# Altium footprint library lib_protel_HC.PCBLIB: 724 footprints (part 42 of 46)
Each footprint in its own frame and in the unit in brackets; x right, y up, seen from the top. Pads: shape width x height; smd on the part's side, far side on the other; paste and mask are expansions set on the pad; w line width, h text height; cw(c..) or ccw(c..) is an arc to the next point about the centre after c.
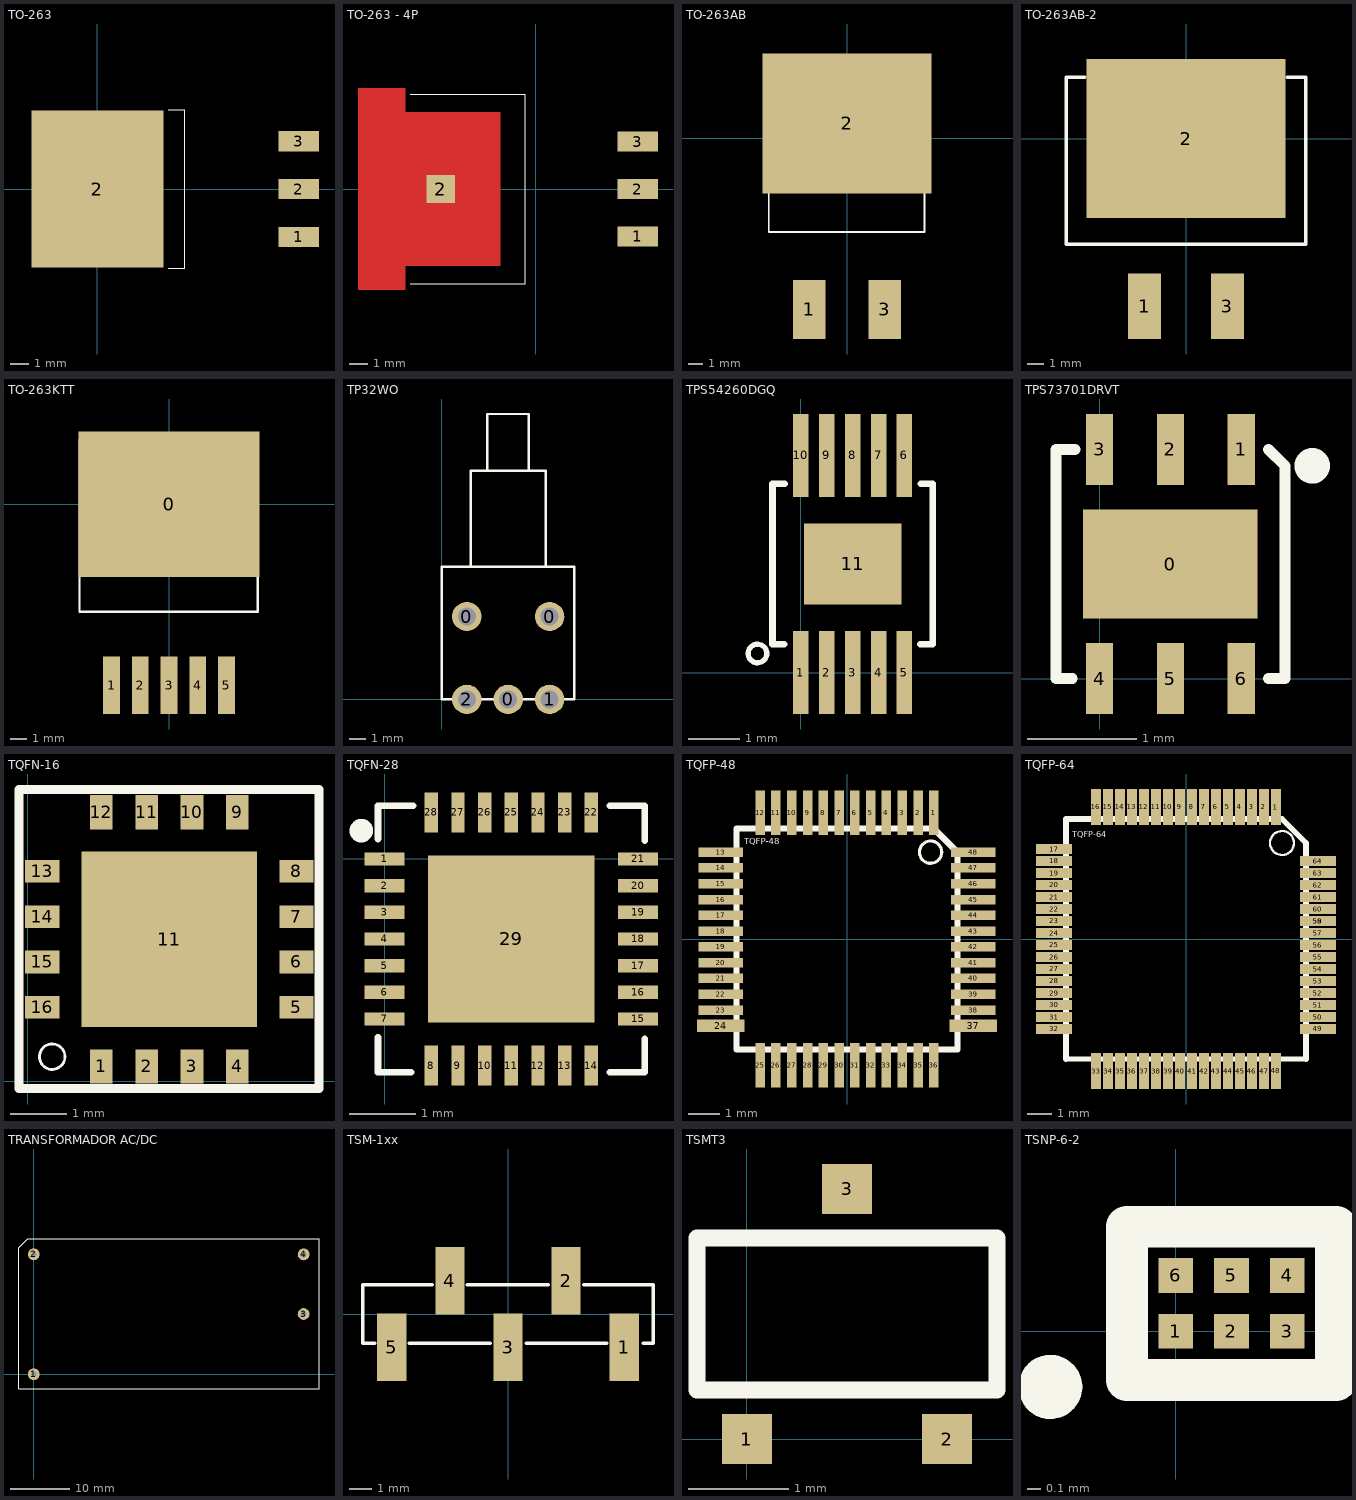
[diagram p41: the footprints below, top view; thin cyan lines are the x and y axes]

## TO-263 [mm] "Regulador LM1084"
height 4.57
pads (4):
  rect 2.16x1.07 smd: 1(10.675,-2.54)
  rect 6.99x8.33 smd mask+0.1: 2(0,0)
  rect 2.16x1.07 smd mask+0.1: 2(10.675,0) 3(10.675,2.54)
Top Overlay:
  lines w0.051: 3.75,-4.204 4.625,-4.204 4.625,4.208 3.75,4.208
3D body "SW3dPS-to-263.STEP": height 4.69, standoff 0, extent -3.66,-5.08 11.78,5.08

## TO-263 - 4P [mm] "Regulador LM1084"
height 4.57
pads (4):
  rect 2.16x1.07 smd: 1(5.493,-2.54)
  rect 1.524x1.524 smd: 2(-5.08,0)
  rect 2.16x1.07 smd mask+0.1: 2(5.493,0) 3(5.493,2.54)
Top Layer:
  region: -1.905,4.127 -6.985,4.127 -6.985,5.397 -9.525,5.397 -9.525,-5.397 -6.985,-5.397 -6.985,-4.127 -1.905,-4.127
Top Overlay:
  lines w0.051: -6.731,-5.08 -0.557,-5.08 -0.557,5.08 -6.731,5.08
3D body "SW3dPS-to-263.STEP": height 4.69, standoff 0, extent -8.89,-5.08 6.55,5.08

## TO-263AB [mm]
pads (3):
  rect 2.2x4 smd: 1(-2.55,-11.6) 3(2.55,-11.6)
  rect 11.43x9.5 smd: 2(0,0.99)
Top Overlay:
  lines w0.127: -5.3,-6.35 -5.3,3.85 5.25,3.85 5.25,-6.35 -5.3,-6.35

## TO-263AB-2 [mm]
height 4.5
pads (3):
  rect 2x4 smd: 1(-2.54,-10.275) 3(2.54,-10.275)
  rect 12.2x9.75 smd: 2(0,0)
Top Overlay:
  lines w0.2: -6.2,3.75 -7.34,3.75 -7.34,-6.47 7.34,-6.47 7.34,3.75 6.2,3.75

## TO-263KTT [mm] "TL2575HV"
height 4.8
pads (6):
  rect 10.7x8.6 smd: 0(0,0)
  rect 1x3.4 smd: 1(-3.4,-10.7) 2(-1.7,-10.7) 3(0,-10.7) 4(1.7,-10.7) 5(3.4,-10.7)
Top Overlay:
  lines w0.127: -5.3,-6.35 -5.3,3.85 5.25,3.85 5.25,-6.35 -5.3,-6.35

## TP32WO [mm] "SWITCH TP32WO"
height 5.5
pads (5):
  round 1.8 hole 1.1: 0(1.524,5.08) 0(4.064,0) 0(6.604,5.08) 1(6.604,0) 2(1.524,0)
Top Overlay:
  lines w0.152: 1.778,8.128 1.778,14.021 6.375,14.021 6.375,8.128 ; 8.1,0 0,0 0,8.128 8.1,8.128 ; 8.103,0 8.103,8.128 ; 2.769,14.021 2.769,17.501 5.334,17.501 5.334,14.021 2.769,14.021

## TPS54260DGQ [mm] "TPS54260DGQ"
height 1.1
pads (11):
  rect 0.3x1.6 smd: 1(0,0) 2(0.5,0) 3(1,0) 4(1.5,0) 5(2,0) 6(2,4.2) 7(1.5,4.2) 8(1,4.2) 9(0.5,4.2) 10(0,4.2)
  rect 1.88x1.57 smd: 11(1,2.1)
Top Overlay:
  circle w0.1: c-0.84,0.37 r0.18
  lines w0.127: -0.32,0.55 -0.55,0.55 -0.55,3.65 -0.31,3.65 ; 2.31,0.55 2.55,0.55 2.55,3.65 2.32,3.65

## TPS73701DRVT [mm] "regulador 1A"
height 0.8
pads (7):
  rect 1.6x1 smd mask+0.05: 0(0.65,1.05)
  rect 0.25x0.65 smd mask+0.07: 1(1.3,2.1) 2(0.65,2.1) 3(0,2.1) 4(0,0) 5(0.65,0) 6(1.3,0)
Top Overlay:
  circle w0.254: c1.95,1.95 r0.035
  lines w0.1: -0.25,0 -0.4,0 -0.4,2.1 -0.225,2.1 ; 1.55,0 1.7,0 1.7,1.95 1.55,2.1

## TQFN-16 [mm] "encapsulado TQFN-16"
height 0.75
pads (17):
  rect 0.4x0.6 smd: 1(1.3,0.26) 2(2.1,0.26) 3(2.9,0.26) 4(3.7,0.26) 9(3.7,4.74) 10(2.9,4.74) 11(2.1,4.74) 12(1.3,4.74)
  rect 0.6x0.4 smd: 5(4.74,1.3) 6(4.74,2.1) 7(4.74,2.9) 8(4.74,3.7) 13(0.26,3.7) 14(0.26,2.9) 15(0.26,2.1) 16(0.26,1.3)
  rect 3.1x3.1 smd: 11(2.5,2.5)
Top Overlay:
  circle w0.051: c0.435,0.43 r0.225
  lines w0.152: -0.15,-0.13 -0.15,5.14 5.14,5.14 5.14,-0.13 -0.15,-0.13

## TQFN-28 [mm]
height 0.8
pads (29):
  rect 0.6x0.2 smd: 1(0,0) 2(0,-0.4) 3(0,-0.8) 4(0,-1.2) 5(0,-1.6) 6(0,-2) 7(0,-2.4) 15(3.8,-2.4) 16(3.8,-2) 17(3.8,-1.6) 18(3.8,-1.2) 19(3.8,-0.8) 20(3.8,-0.4) 21(3.8,0)
  rect 0.2x0.6 smd: 8(0.7,-3.1) 9(1.1,-3.1) 10(1.5,-3.1) 11(1.9,-3.1) 12(2.3,-3.1) 13(2.7,-3.1) 14(3.1,-3.1) 22(3.1,0.7) 23(2.7,0.7) 24(2.3,0.7) 25(1.9,0.7) 26(1.5,0.7) 27(1.1,0.7) 28(0.7,0.7)
  rect 2.5x2.5 smd: 29(1.9,-1.2)
Top Overlay:
  circle w0.254: c-0.35,0.425 r0.05
  lines w0.1: -0.1,-2.675 -0.1,-3.2 ; -0.1,0.3 -0.1,0.8 0.425,0.8 ; 0.4,-3.2 -0.1,-3.2 ; 3.375,-3.2 3.9,-3.2 3.9,-2.7 ; 3.375,0.8 3.9,0.8 3.9,0.275 ; -0.1,-3.2 -0.1,-3.2

## TQFP-48 [mm]
height 2
pads (48):
  rect 0.3x1.4 smd: 1(2.75,4) 2(2.25,4) 3(1.75,4) 4(1.25,4) 5(0.75,4) 6(0.25,4) 7(-0.25,4) 8(-0.75,4) 9(-1.25,4) 10(-1.75,4) 11(-2.25,4) 12(-2.75,4) 25(-2.75,-4) 26(-2.25,-4) 27(-1.75,-4) 28(-1.25,-4) 29(-0.75,-4) 30(-0.25,-4) 31(0.25,-4) 32(0.75,-4) 33(1.25,-4) 34(1.75,-4) 35(2.25,-4) 36(2.75,-4)
  rect 1.4x0.3 smd: 13(-4,2.75) 14(-4,2.25) 15(-4,1.75) 16(-4,1.25) 17(-4,0.75) 18(-4,0.25) 19(-4,-0.25) 20(-4,-0.75) 21(-4,-1.25) 22(-4,-1.75) 23(-4,-2.25) 38(4,-2.25) 39(4,-1.75) 40(4,-1.25) 41(4,-0.75) 42(4,-0.25) 43(4,0.25) 44(4,0.75) 45(4,1.25) 46(4,1.75) 47(4,2.25) 48(4,2.75)
  rect 1.5x0.4 smd: 24(-4,-2.75) 37(4,-2.75)
Top Overlay:
  circle w0.1: c2.646,2.75 r0.353
  lines w0.2: -3.5,-3.5 -3.5,3.5 2.75,3.5 3.5,2.75 3.5,-3.5 -3.5,-3.5
  text "TQFP-48" at -3.25,3 h0.2

## TQFP-64 [mm]
pads (64):
  rect 0.4x1.5 smd: 1(3.75,5.5) 2(3.25,5.5) 3(2.75,5.5) 4(2.25,5.5) 5(1.75,5.5) 6(1.25,5.5) 7(0.75,5.5) 8(0.25,5.5) 9(-0.25,5.5) 10(-0.75,5.5) 11(-1.25,5.5) 12(-1.75,5.5) 13(-2.25,5.5) 14(-2.75,5.5) 15(-3.25,5.5) 16(-3.75,5.5) 33(-3.75,-5.5) 34(-3.25,-5.5) 35(-2.75,-5.5) 36(-2.25,-5.5) 37(-1.75,-5.5) 38(-1.25,-5.5) 39(-0.75,-5.5) 40(-0.25,-5.5) 41(0.25,-5.5) 42(0.75,-5.5) 43(1.25,-5.5) 44(1.75,-5.5) 45(2.25,-5.5) 46(2.75,-5.5) 47(3.25,-5.5) 48(3.75,-5.5)
  rect 1.5x0.4 smd: 17(-5.5,3.75) 18(-5.5,3.25) 19(-5.5,2.75) 20(-5.5,2.25) 21(-5.5,1.75) 22(-5.5,1.25) 23(-5.5,0.75) 24(-5.5,0.25) 25(-5.5,-0.25) 26(-5.5,-0.75) 27(-5.5,-1.25) 28(-5.5,-1.75) 29(-5.5,-2.25) 30(-5.5,-2.75) 31(-5.5,-3.25) 32(-5.5,-3.75) 49(5.5,-3.75) 50(5.5,-3.25) 51(5.5,-2.75) 52(5.5,-2.25) 53(5.5,-1.75) 54(5.5,-1.25) 55(5.5,-0.75) 56(5.5,-0.25) 57(5.5,0.25) 58(5.5,0.75) 59(5.5,0.75) 60(5.5,1.25) 61(5.5,1.75) 62(5.5,2.25) 63(5.5,2.75) 64(5.5,3.25)
Top Overlay:
  circle w0.1: c4,4 r0.5
  lines w0.2: -5,-5 5,-5
  lines w0.254: -5,-5 -5,5 4,5 5,4 5,-5
  text "TQFP-64" at -4.75,4.25 h0.25

## TRANSFORMADOR AC/DC [mm] "Transformador ECL10US10-P de XP Power"
height 23
pads (4):
  round 2 hole 1: 1(0,0) 2(0,20.3) 3(45.7,10.2) 4(45.7,20.3)
Top Overlay:
  lines w0.2: -2.5,-2.5 48.3,-2.5 48.3,22.9 -1,22.9 -2.5,21.4 -2.5,-2.5

## TSM-1xx [mm] "para TSM-1XX-XX-XX-SV-XX-XXX-XX"
pads (5):
  rect 1.27x2.95 smd: 1(5.08,-1.46) 2(2.54,1.46) 3(0,-1.46) 4(-2.54,1.46) 5(-5.08,-1.46)
Top Overlay:
  lines w0.15: -5.825,-1.275 -6.35,-1.275 -6.35,1.275 -3.3,1.275 ; -4.325,-1.275 -0.775,-1.275 ; -1.775,1.275 1.75,1.275 ; 0.8,-1.275 4.325,-1.275 ; 3.3,1.275 6.35,1.275 6.35,-1.275 5.9,-1.275
3D body "Samtec-TSM-105-02-T-SV.step": height 11.94, standoff 0, extent -6.25,-2.4 6.45,2.502

## TSMT3 [mm] "TSMT3 MOSFET CH P"
height 1
pads (3):
  rect 0.5x0.5 smd: 1(0,0) 2(2,0) 3(1,2.5)
Top Overlay:
  lines w0.17: -0.5,0.49 -0.5,2.01 2.5,2.01 2.5,0.49 -0.5,0.49

## TSNP-6-2 [mm] "TSNP-6-2, 6-XSON, 6XFDFN"
height 0.375
pads (6):
  rect 0.25x0.25 smd mask+0.07: 1(0,0) 2(0.4,0) 3(0.8,0) 4(0.8,0.4) 5(0.4,0.4) 6(0,0.4)
Top Overlay:
  circle w0.254: c-0.9,-0.4 r0.103
  lines w0.3: 1.15,-0.35 -0.35,-0.35 -0.35,0.75 1.15,0.75 ; 1.15,-0.3 1.15,0.75 ; 1.15,0.75 1.15,0.75